# Altium footprint library PCB_PASSIVE.PcbLib: 100 footprints (part 2 of 7)
Each footprint in its own frame and in the unit in brackets; x right, y up, seen from the top. Pads: shape width x height; smd on the part's side, far side on the other; paste and mask are expansions set on the pad; w line width, h text height; cw(c..) or ccw(c..) is an arc to the next point about the centre after c.
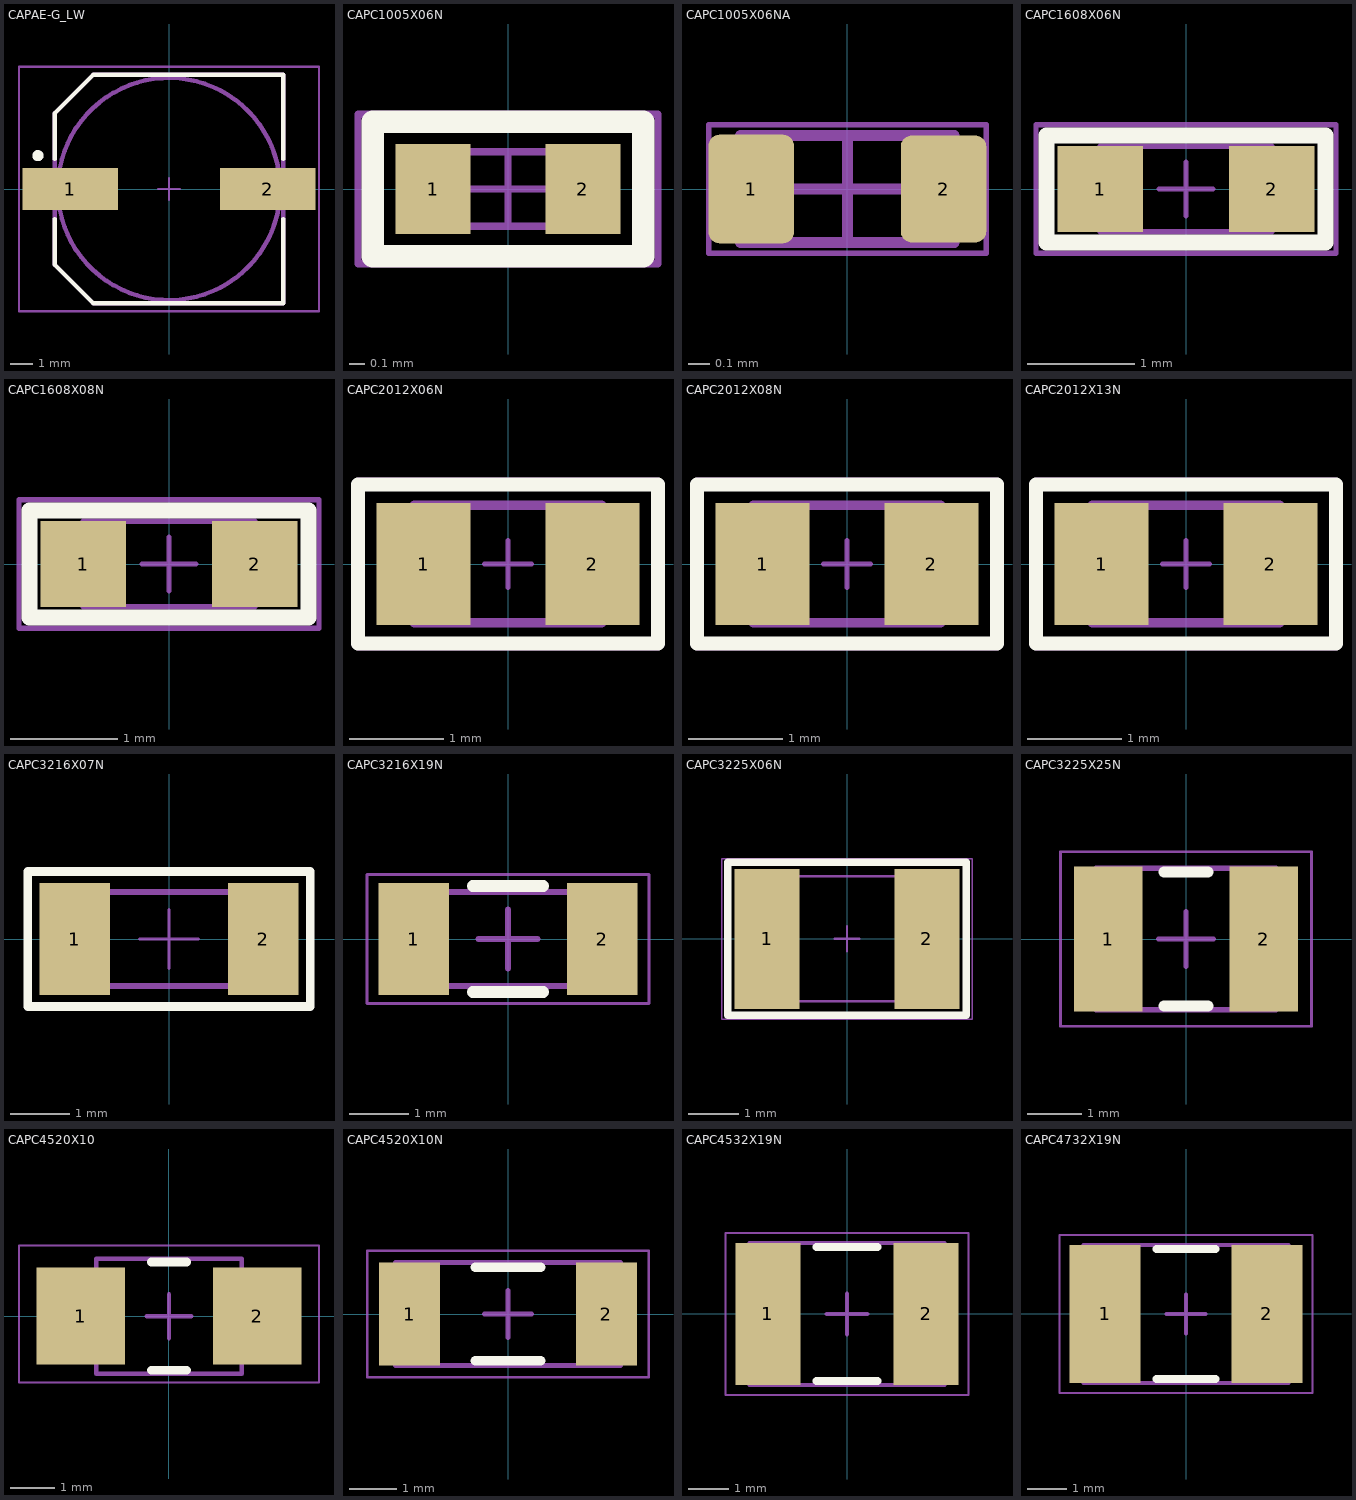
[diagram p1: the footprints below, top view; thin cyan lines are the x and y axes]

## CAPAE-G_LW [mm]
height 10.5
pads (2):
  rect 4.3x1.9 smd paste-100 mask+0.05: 1(-4.45,0) 2(4.45,0)
Top Overlay:
  circle w0.25: c-5.9,1.5 r0.125
  lines w0.2: -5.15,-1.35 -5.15,-3.4 -3.4,-5.15 5.15,-5.15 5.15,-1.35 ; -5.15,1.35 -5.15,3.4 -3.4,5.15 5.15,5.15 5.15,1.35
Top Paste:
  region: 2.3,0.95 6.6,0.95 6.6,-0.95 2.3,-0.95 2.95,-0.38 2.95,0.38
  region: -2.3,-0.95 -6.6,-0.95 -6.6,0.95 -2.3,0.95 -2.95,0.38 -2.95,-0.38
Mechanical 14:
  text ".Designator" at 0,0 h1.5
Mechanical 15:
  circle w0.2: c0,0 r5
  lines w0.2: -5.15,-3.4 -5.15,3.4 -3.4,5.15 5.15,5.15 5.15,-5.15 -3.4,-5.15 -5.15,-3.4
Mechanical 20:
  lines w0.1: -0.5,0 0.5,0 ; 0,-0.5 0,0.5 ; -6.75,-5.5 -6.75,5.5 6.75,5.5 6.75,-5.5 -6.75,-5.5
3D body "ALU-SCG.STEP": height 10.2, standoff 0, extent -5.8,-5.15 5.8,5.15

## CAPC1005X06N [mm] "Chip Capacitor, 2-Leads, Body 1,00x0,50mm, IPC Low Density"
height 0.6
pads (2):
  rect 0.5x0.6 smd mask+0.05: 1(-0.5,0) 2(0.5,0)
Top Overlay:
  lines w0.15: -0.9,-0.45 0.9,-0.45 0.9,0.45 -0.9,0.45 -0.9,-0.45
Mechanical 11:
  text ".Designator" at -0.9,0.7 h0.3
Mechanical 14:
  lines w0.05: -0.3,-0.25 -0.3,0.25 ; 0.3,-0.25 0.3,0.25 ; -0.5,-0.25 -0.5,0.25 0.5,0.25 0.5,-0.25 -0.5,-0.25
Mechanical 15:
  lines w0.05: -0.25,0 0.25,0 ; 0,-0.25 0,0.25 ; -1,-0.5 -1,0.5 1,0.5 1,-0.5 -1,-0.5
3D body "C0402.STEP": height 0.51, standoff 0, extent -0.508,-0.254 0.508,0.254

## CAPC1005X06NA [mm] "Chip Capacitor, 2-Leads, Body 1,00x0,50mm, IPC Low Density"
pads (2):
  rrect25% 0.4x0.508 smd: 1(-0.45,0)
  rrect25% 0.4x0.5 smd: 2(0.45,0)
Mechanical 11:
  text ".Designator" at -0.7,0.5 h0.3
Mechanical 14:
  lines w0.05: -0.3,-0.25 -0.3,0.25 ; 0.3,-0.25 0.3,0.25 ; -0.5,-0.25 0.5,-0.25 0.5,0.25 -0.5,0.25 -0.5,-0.25
Mechanical 15:
  lines w0.025: -0.65,-0.3 -0.65,0.3 0.65,0.3 0.65,-0.3 -0.65,-0.3
  lines w0.05: -0.25,0 0.25,0 ; 0,-0.25 0,0.25
3D body "C0402.STEP": height 0.51, standoff 0, extent -0.508,-0.254 0.508,0.254

## CAPC1608X06N [mm] "Chip Capacitor, 2-Leads, Body 1,60x0,80mm, IPC Low Density"
height 0.6
pads (2):
  rect 0.8x0.8 smd mask+0.05: 1(-0.8,0) 2(0.8,0)
Top Overlay:
  lines w0.15: -1.3,-0.5 -1.3,0.5 1.3,0.5 1.3,-0.5 -1.3,-0.5
Mechanical 11:
  text ".Designator" at -1.4,0.8 h0.3
Mechanical 14:
  lines w0.05: -0.6,-0.4 -0.6,0.4 ; 0.6,-0.4 0.6,0.4 ; -0.8,-0.4 0.8,-0.4 0.8,0.4 -0.8,0.4 -0.8,-0.4
Mechanical 15:
  lines w0.05: -0.25,0 0.25,0 ; 0,-0.25 0,0.25 ; -1.4,-0.6 1.4,-0.6 1.4,0.6 -1.4,0.6 -1.4,-0.6
3D body "C1608X.step": height 0.57, standoff 0, extent -0.8,-0.41 0.8,0.41

## CAPC1608X08N [mm] "Chip Capacitor, 2-Leads, Body 1,60x0,80mm, IPC Low Density"
height 0.8
pads (2):
  rect 0.8x0.8 smd mask+0.05: 1(-0.8,0) 2(0.8,0)
Top Overlay:
  lines w0.15: -1.3,-0.5 -1.3,0.5 1.3,0.5 1.3,-0.5 -1.3,-0.5
Mechanical 11:
  text ".Designator" at -1.4,0.8 h0.3
Mechanical 14:
  lines w0.05: -0.6,-0.4 -0.6,0.4 ; 0.6,-0.4 0.6,0.4 ; -0.8,-0.4 0.8,-0.4 0.8,0.4 -0.8,0.4 -0.8,-0.4
Mechanical 15:
  lines w0.05: -0.25,0 0.25,0 ; 0,-0.25 0,0.25 ; -1.4,-0.6 1.4,-0.6 1.4,0.6 -1.4,0.6 -1.4,-0.6
3D body "C1608X.step": height 0.57, standoff 0, extent -0.8,-0.41 0.8,0.41

## CAPC2012X06N [mm] "Chip Capacitor, 2-Leads, Body 2,00x1,25mm, IPC Low Density"
height 0.6
pads (2):
  rect 1x1.3 smd: 1(-0.9,0) 2(0.9,0)
Top Overlay:
  lines w0.15: -1.6,-0.85 -1.6,0.85 1.6,0.85 1.6,-0.85 -1.6,-0.85
Mechanical 11:
  text ".Designator" at -1.6,1.1 h0.3
Mechanical 14:
  lines w0.1: -0.6,-0.625 -0.6,0.625 ; 0.6,-0.625 0.6,0.625 ; -1,-0.625 1,-0.625 1,0.625 -1,0.625 -1,-0.625
Mechanical 15:
  lines w0.05: -0.25,0 0.25,0 ; 0,-0.25 0,0.25 ; -1.6,-0.9 -1.6,0.9 1.6,0.9 1.6,-0.9 -1.6,-0.9
3D body "0805Cap.step": height 0.78, standoff 0, extent -1,-0.625 1,0.625

## CAPC2012X08N [mm] "Chip Capacitor, 2-Leads, Body 2,00x1,25mm, IPC Low Density"
height 0.8
pads (2):
  rect 1x1.3 smd: 1(-0.9,0) 2(0.9,0)
Top Overlay:
  lines w0.15: -1.6,-0.85 -1.6,0.85 1.6,0.85 1.6,-0.85 -1.6,-0.85
Mechanical 11:
  text ".Designator" at -1.6,1.1 h0.3
Mechanical 14:
  lines w0.1: -0.6,-0.625 -0.6,0.625 ; 0.6,-0.625 0.6,0.625 ; -1,-0.625 1,-0.625 1,0.625 -1,0.625 -1,-0.625
Mechanical 15:
  lines w0.05: -0.25,0 0.25,0 ; 0,-0.25 0,0.25 ; -1.6,-0.9 -1.6,0.9 1.6,0.9 1.6,-0.9 -1.6,-0.9
3D body "0805Cap.step": height 0.78, standoff 0, extent -1,-0.625 1,0.625

## CAPC2012X13N [mm] "Chip Capacitor, 2-Leads, Body 2,00x1,25mm, IPC Medium Density"
height 1.3
pads (2):
  rect 1x1.3 smd: 1(-0.9,0) 2(0.9,0)
Top Overlay:
  lines w0.15: -1.6,-0.85 -1.6,0.85 1.6,0.85 1.6,-0.85 -1.6,-0.85
Mechanical 11:
  text ".Designator" at -1.6,1.1 h0.3
Mechanical 14:
  lines w0.1: -0.6,-0.625 -0.6,0.625 ; 0.6,-0.625 0.6,0.625 ; -1,-0.625 1,-0.625 1,0.625 -1,0.625 -1,-0.625
Mechanical 15:
  lines w0.05: -0.25,0 0.25,0 ; 0,-0.25 0,0.25 ; -1.6,-0.9 -1.6,0.9 1.6,0.9 1.6,-0.9 -1.6,-0.9
3D body "CAPC2012X13N.step": height 1.3, standoff 0, extent -1.05,-0.675 1.05,0.675

## CAPC3216X07N [mm] "Chip Capacitor, 2-Leads, Body 3,10x1,60mm, IPC Low Density"
pads (2):
  rect 1.2x1.9 smd: 1(-1.6,0) 2(1.6,0)
Top Overlay:
  lines w0.15: -2.4,-1.15 2.4,-1.15 2.4,1.15 -2.4,1.15 -2.4,-1.15
Mechanical 11:
  text ".Designator" at -2.2,1.5 h0.3
Mechanical 14:
  lines w0.1: -1.2,-0.8 -1.2,0.8 ; 1.2,-0.8 1.2,0.8 ; -1.6,-0.8 -1.6,0.8 1.6,0.8 1.6,-0.8 -1.6,-0.8
Mechanical 15:
  lines w0.05: -0.5,0 0.5,0 ; 0,-0.5 0,0.5 ; -2.4,-1.1 2.4,-1.1 2.4,1.1 -2.4,1.1 -2.4,-1.1
3D body "C1206.STEP": height 1, standoff 0, extent -1.56,-0.8 1.64,0.8

## CAPC3216X19N [mm] "Chip Capacitor, 2-Leads, Body 3,20x1,60mm, IPC Medium Density"
height 1.9
pads (2):
  rect 1.2x1.9 smd: 1(-1.6,0) 2(1.6,0)
Top Overlay:
  lines w0.2: -0.6,-0.9 0.6,-0.9 ; -0.6,0.9 0.6,0.9
Mechanical 11:
  text ".Designator" at -2.2,1.5 h0.3
Mechanical 14:
  lines w0.1: -1.2,-0.8 -1.2,0.8 ; 1.2,-0.8 1.2,0.8 ; -1.6,-0.8 -1.6,0.8 1.6,0.8 1.6,-0.8 -1.6,-0.8
Mechanical 15:
  lines w0.05: -2.4,-1.1 2.4,-1.1 2.4,1.1 -2.4,1.1 -2.4,-1.1
  lines w0.1: -0.5,0 0.5,0 ; 0,-0.5 0,0.5
3D body "CAPC3216X19N.step": height 1.9, standoff 0, extent -1.7,-0.9 1.7,0.9

## CAPC3225X06N [mm] "Chip Capacitor, 2-Leads, Body 3,2x2,5mm, IPC Low Density"
height 2.5
pads (2):
  rect 1.3x2.8 smd: 1(-1.6,0) 2(1.6,0)
Top Overlay:
  lines w0.15: -2.38,-1.53 -2.38,1.53 2.38,1.53 2.38,-1.53 -2.38,-1.53
Mechanical 11:
  text ".Designator" at -1.6,1.1 h0.3
Mechanical 14:
  lines w0.05: -1.1,-1.25 -1.1,1.25 ; 1.1,-1.25 1.1,1.25 ; -1.6,-1.25 -1.6,1.25 1.6,1.25 1.6,-1.25 -1.6,-1.25
Mechanical 15:
  lines w0.025: -2.5,-1.605 -2.5,1.6 2.5,1.6 2.5,-1.605 -2.5,-1.605
  lines w0.05: -0.25,0 0.25,0 ; 0,-0.25 0,0.25
3D body "C1210.step": height 0.57, standoff 0, extent -1.6,-1.26 1.6,1.26

## CAPC3225X25N [mm] "Chip Capacitor, 2-Leads, Body 3,20x2,50mm, IPC Medium Density"
height 2.5
pads (2):
  rect 1.25x2.65 smd: 1(-1.425,0) 2(1.425,0)
Top Overlay:
  lines w0.2: -0.4,-1.225 0.4,-1.225 ; -0.4,1.225 0.4,1.225
Mechanical 11:
  text ".Designator" at -2.175,1.9 h1
Mechanical 14:
  lines w0.1: -1.65,-1.3 1.65,-1.3 1.65,1.3 -1.65,1.3 -1.65,-1.3
Mechanical 15:
  lines w0.05: -2.3,-1.6 2.3,-1.6 2.3,1.6 -2.3,1.6 -2.3,-1.6
  lines w0.1: -0.5,0 0.5,0 ; 0,-0.5 0,0.5
3D body: height 2.5, standoff 0, extent 1.15,-1.3 1.65,1.3
3D body: height 2.5, standoff 0, extent -1.65,-1.3 -1.15,1.3
3D body "SW3dPS-CAPC3225.STEP": height 2.5, standoff 0, extent -1.6,-1.25 1.6,1.25

## CAPC4520X10 [mm]
pads (2):
  rect 2x2.2 smd: 1(-2,0) 2(2,0)
Top Overlay:
  lines w0.2: -0.4,-1.225 0.4,-1.225 ; -0.4,1.225 0.4,1.225
Mechanical 11:
  text ".Designator" at -2.175,1.9 h1
Mechanical 14:
  lines w0.1: -1.65,-1.3 -1.65,1.3 1.65,1.3 1.65,-1.3 -1.65,-1.3
Mechanical 15:
  lines w0.05: -3.4,-1.5 -3.4,1.6 3.4,1.6 3.4,-1.5 -3.4,-1.5
  lines w0.1: -0.5,0 0.5,0 ; 0,-0.5 0,0.5
3D body "User Library-Chip Cap_MLCC_1808 (4520)_D.STEP": height 1.25, standoff 0, extent -2.2,-1.03 2.3,1

## CAPC4520X10N [mm] "Chip Capacitor, 2-Leads, Body 4,50x2,00mm, IPC Medium Density"
height 1
pads (2):
  rect 1.3x2.2 smd: 1(-2.1,0) 2(2.1,0)
Top Overlay:
  lines w0.2: -0.7,-1 0.7,-1 ; -0.7,1 0.7,1
Mechanical 11:
  text ".Designator" at -0.85,-0.15 h0.3
Mechanical 14:
  lines w0.1: -1.9,-1.1 -1.9,1.1 ; 1.9,-1.1 1.9,1.1 ; -2.4,-1.1 -2.4,1.1 2.4,1.1 2.4,-1.1 -2.4,-1.1
Mechanical 15:
  lines w0.05: -3,-1.35 -3,1.35 3,1.35 3,-1.35 -3,-1.35
  lines w0.1: -0.5,0 0.5,0 ; 0,-0.5 0,0.5
3D body "CAPC4520X10N.step": height 1, standoff 0, extent -2.4,-1.1 2.4,1.1

## CAPC4532X19N [mm] "Chip Capacitor, 2-Leads, Body 4,50x3,20mm, IPC Medium Density"
height 1.85
pads (2):
  rect 1.6x3.5 smd: 1(-1.95,0) 2(1.95,0)
Top Overlay:
  lines w0.2: -0.75,-1.65 0.75,-1.65 ; -0.75,1.65 0.75,1.65
Mechanical 11:
  text ".Designator" at -1.35,2.05 h0.3
Mechanical 14:
  lines w0.1: -1.8,-1.75 -1.8,1.75 ; 1.8,-1.75 1.8,1.75 ; -2.4,-1.75 2.4,-1.75 2.4,1.75 -2.4,1.75 -2.4,-1.75
Mechanical 15:
  lines w0.05: -3,-2 3,-2 3,2 -3,2 -3,-2
  lines w0.1: -0.5,0 0.5,0 ; 0,-0.5 0,0.5
3D body "SW3dPS-1812 SMD Capacitor.STEP": height 1.61, standoff 0.01, extent -2.25,-1.6 2.25,1.6

## CAPC4732X19N [mm] "Chip Capacitor, 2-Leads, Body 4,70x3,20mm, IPC Medium Density"
height 1.85
pads (2):
  rect 1.8x3.5 smd: 1(-2.05,0) 2(2.05,0)
Top Overlay:
  lines w0.2: -0.75,-1.65 0.75,-1.65 ; -0.75,1.65 0.75,1.65
Mechanical 11:
  text ".Designator" at -0.7,-0.4 h1
Mechanical 14:
  lines w0.1: -2.6,-1.75 2.6,-1.75 2.6,1.75 -2.6,1.75 -2.6,-1.75
Mechanical 15:
  lines w0.05: -3.2,-2 3.2,-2 3.2,2 -3.2,2 -3.2,-2
  lines w0.1: -0.5,0 0.5,0 ; 0,-0.5 0,0.5
3D body "CAPC4732X19N.step": height 1.85, standoff 0, extent -2.6,-1.75 2.6,1.75